# Altium footprint library Connector.PcbLib: 536 footprints (part 13 of 34)
Each footprint in its own frame and in the unit in brackets; x right, y up, seen from the top. Pads: shape width x height; smd on the part's side, far side on the other; paste and mask are expansions set on the pad; w line width, h text height; cw(c..) or ccw(c..) is an arc to the next point about the centre after c.
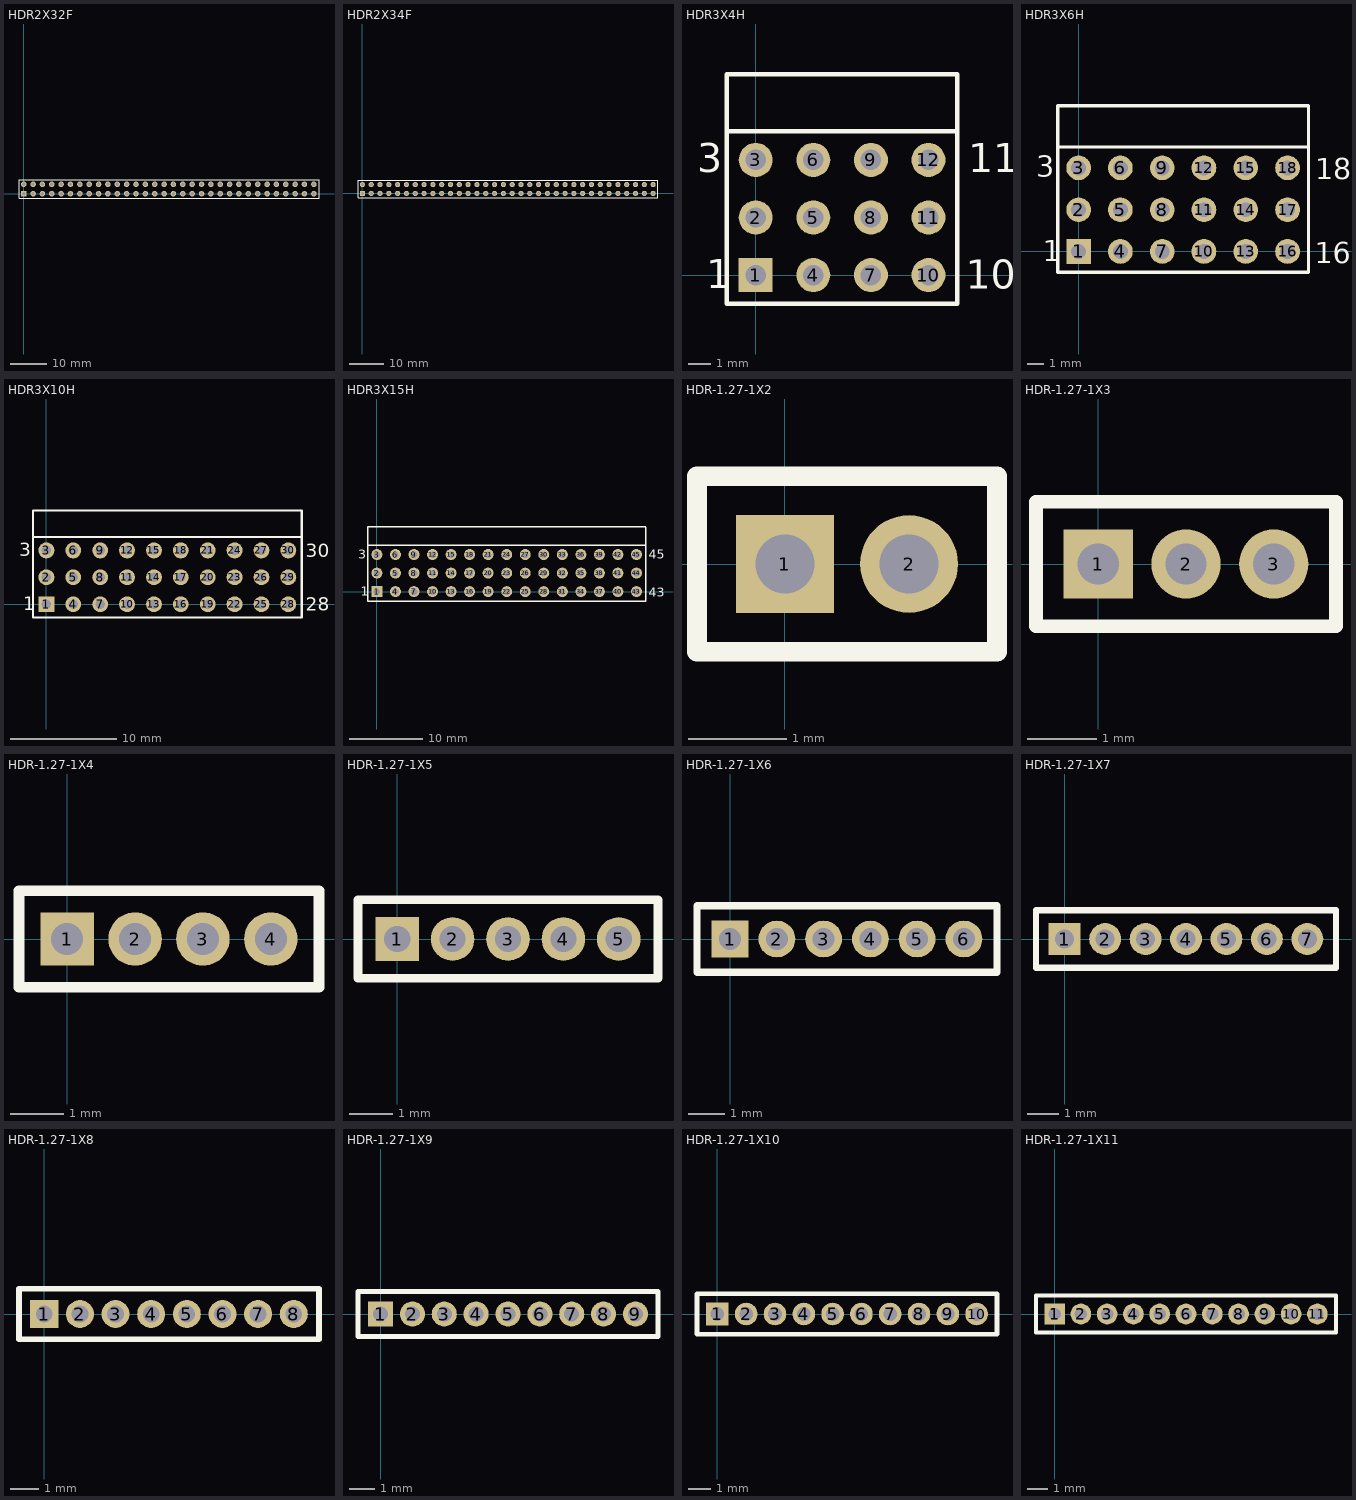
[diagram p12: the footprints below, top view; thin cyan lines are the x and y axes]

## HDR2X32F [mm] "Connector; Header; 30x2 Position"
pads (64):
  rect 1.5x1.5 hole 0.9: 1(0,0)
  round 1.5 hole 0.9: 2(0,2.54) 3(2.54,0) 4(2.54,2.54) 5(5.08,0) 6(5.08,2.54) 7(7.62,0) 8(7.62,2.54) 9(10.16,0) 10(10.16,2.54) 11(12.7,0) 12(12.7,2.54) 13(15.24,0) 14(15.24,2.54) 15(17.78,0) 16(17.78,2.54) 17(20.32,0) 18(20.32,2.54) 19(22.86,0) 20(22.86,2.54) 21(25.4,0) 22(25.4,2.54) 23(27.94,0) 24(27.94,2.54) 25(30.48,0) 26(30.48,2.54) 27(33.02,0) 28(33.02,2.54) 29(35.56,0) 30(35.56,2.54) 31(38.1,0) 32(38.1,2.54) 33(40.64,0) 34(40.64,2.54) 35(43.18,0) 36(43.18,2.54) 37(45.72,0) 38(45.72,2.54) 39(48.26,0) 40(48.26,2.54) 41(50.8,0) 42(50.8,2.54) 43(53.34,0) 44(53.34,2.54) 45(55.88,0) 46(55.88,2.54) 47(58.42,0) 48(58.42,2.54) 49(60.96,0) 50(60.96,2.54) 51(63.5,0) 52(63.5,2.54) 53(66.04,0) 54(66.04,2.54) 55(68.58,0) 56(68.58,2.54) 57(71.12,0) 58(71.12,2.54) 59(73.66,0) 60(73.66,2.54) 61(76.2,0) 62(76.2,2.54) 63(78.74,0) 64(78.74,2.54)
Top Overlay:
  lines w0.2: -1.27,-1.27 -1.27,3.81 80.14,3.81 80.14,-1.27 -1.27,-1.27
3D body "HEADER_1X30.STEP": height 8.61, standoff -2.93, extent -1.295,1.27 74.905,3.81
3D body "HEADER_1X30.STEP": height 8.61, standoff -2.93, extent -1.295,-1.27 74.905,1.27
3D body "HEADER_1X2.STEP": height 8.61, standoff -2.93, extent 74.93,1.27 80.01,3.81
3D body "HEADER_1X2.STEP": height 8.61, standoff -2.93, extent 74.93,-1.27 80.01,1.27

## HDR2X34F [mm] "Connector; Header; 30x2 Position"
pads (68):
  rect 1.5x1.5 hole 0.9: 1(0,0)
  round 1.5 hole 0.9: 2(0,2.54) 3(2.54,0) 4(2.54,2.54) 5(5.08,0) 6(5.08,2.54) 7(7.62,0) 8(7.62,2.54) 9(10.16,0) 10(10.16,2.54) 11(12.7,0) 12(12.7,2.54) 13(15.24,0) 14(15.24,2.54) 15(17.78,0) 16(17.78,2.54) 17(20.32,0) 18(20.32,2.54) 19(22.86,0) 20(22.86,2.54) 21(25.4,0) 22(25.4,2.54) 23(27.94,0) 24(27.94,2.54) 25(30.48,0) 26(30.48,2.54) 27(33.02,0) 28(33.02,2.54) 29(35.56,0) 30(35.56,2.54) 31(38.1,0) 32(38.1,2.54) 33(40.64,0) 34(40.64,2.54) 35(43.18,0) 36(43.18,2.54) 37(45.72,0) 38(45.72,2.54) 39(48.26,0) 40(48.26,2.54) 41(50.8,0) 42(50.8,2.54) 43(53.34,0) 44(53.34,2.54) 45(55.88,0) 46(55.88,2.54) 47(58.42,0) 48(58.42,2.54) 49(60.96,0) 50(60.96,2.54) 51(63.5,0) 52(63.5,2.54) 53(66.04,0) 54(66.04,2.54) 55(68.58,0) 56(68.58,2.54) 57(71.12,0) 58(71.12,2.54) 59(73.66,0) 60(73.66,2.54) 61(76.2,0) 62(76.2,2.54) 63(78.74,0) 64(78.74,2.54) 65(81.28,0) 66(81.28,2.54) 67(83.82,0) 68(83.82,2.54)
Top Overlay:
  lines w0.2: -1.27,-1.27 85.22,-1.27 85.22,3.81 -1.27,3.81 -1.27,-1.27
Bottom Overlay:
  text "1" at -55.88,-0.508 h1.27
3D body "HEADER_1X2.STEP": height 8.61, standoff -2.93, extent 74.93,-1.27 80.01,1.27
3D body "HEADER_1X2.STEP": height 8.61, standoff -2.93, extent 74.93,1.27 80.01,3.81
3D body "HEADER_1X30.STEP": height 8.61, standoff -2.93, extent -1.295,-1.27 74.905,1.27
3D body "HEADER_1X30.STEP": height 8.61, standoff -2.93, extent -1.295,1.27 74.905,3.81
3D body "HEADER_1X2.STEP": height 8.61, standoff -2.93, extent 80.01,1.27 85.09,3.81
3D body "HEADER_1X2.STEP": height 8.61, standoff -2.93, extent 80.01,-1.27 85.09,1.27

## HDR3X4H [mm] "3排4针排针"
pads (12):
  rect 1.5x1.5 hole 0.9: 1(0,0)
  round 1.5 hole 0.9: 2(0,2.54) 3(0,5.08) 4(2.54,0) 5(2.54,2.54) 6(2.54,5.08) 7(5.08,0) 8(5.08,2.54) 9(5.08,5.08) 10(7.62,0) 11(7.62,2.54) 12(7.62,5.08)
Top Overlay:
  lines w0.2: 8.89,-1.27 -1.27,-1.27 -1.27,6.35 ; 8.89,-1.245 8.89,6.35 ; -1.27,6.35 8.89,6.35 ; -1.27,6.35 -1.27,8.865 8.89,8.865 8.89,6.35
  text "1" at -2.184,-0.584 h1.27
  text "3" at -2.591,4.547 h1.27
  text "10" at 9.271,-0.61 h1.27
  text "11" at 9.373,4.547 h1.27

## HDR3X6H [mm] "3排6针排针"
pads (18):
  rect 1.5x1.5 hole 0.9: 1(0,0)
  round 1.5 hole 0.9: 2(0,2.54) 3(0,5.08) 4(2.54,0) 5(2.54,2.54) 6(2.54,5.08) 7(5.08,0) 8(5.08,2.54) 9(5.08,5.08) 10(7.62,0) 11(7.62,2.54) 12(7.62,5.08) 13(10.16,0) 14(10.16,2.54) 15(10.16,5.08) 16(12.7,0) 17(12.7,2.54) 18(12.7,5.08)
Top Overlay:
  lines w0.2: -1.27,6.35 13.97,6.35 ; -1.27,6.35 -1.27,8.865 13.97,8.865 13.97,6.35 ; -1.27,6.35 -1.27,-1.27 13.97,-1.27 13.97,6.35
  text "1" at -2.184,-0.584 h1.27
  text "3" at -2.591,4.547 h1.27
  text "16" at 14.351,-0.711 h1.27
  text "18" at 14.376,4.394 h1.27

## HDR3X10H [mm] "3排10针排针"
pads (30):
  rect 1.5x1.5 hole 0.9: 1(0,0)
  round 1.5 hole 0.9: 2(0,2.54) 3(0,5.08) 4(2.54,0) 5(2.54,2.54) 6(2.54,5.08) 7(5.08,0) 8(5.08,2.54) 9(5.08,5.08) 10(7.62,0) 11(7.62,2.54) 12(7.62,5.08) 13(10.16,0) 14(10.16,2.54) 15(10.16,5.08) 16(12.7,0) 17(12.7,2.54) 18(12.7,5.08) 19(15.24,0) 20(15.24,2.54) 21(15.24,5.08) 22(17.78,0) 23(17.78,2.54) 24(17.78,5.08) 25(20.32,0) 26(20.32,2.54) 27(20.32,5.08) 28(22.86,0) 29(22.86,2.54) 30(22.86,5.08)
Top Overlay:
  lines w0.2: 24.13,6.248 24.13,-1.27 -1.27,-1.27 -1.27,6.35 ; -1.27,6.35 24.13,6.35 24.13,8.865 -1.27,8.865 -1.27,6.35
  text "1" at -2.184,-0.584 h1.27
  text "3" at -2.591,4.547 h1.27
  text "28" at 24.486,-0.61 h1.27
  text "30" at 24.486,4.42 h1.27

## HDR3X15H [mm] "3排15针排针"
pads (45):
  rect 1.5x1.5 hole 0.9: 1(0,0)
  round 1.5 hole 0.9: 2(0,2.54) 3(0,5.08) 4(2.54,0) 5(2.54,2.54) 6(2.54,5.08) 7(5.08,0) 8(5.08,2.54) 9(5.08,5.08) 10(7.62,0) 11(7.62,2.54) 12(7.62,5.08) 13(10.16,0) 14(10.16,2.54) 15(10.16,5.08) 16(12.7,0) 17(12.7,2.54) 18(12.7,5.08) 19(15.24,0) 20(15.24,2.54) 21(15.24,5.08) 22(17.78,0) 23(17.78,2.54) 24(17.78,5.08) 25(20.32,0) 26(20.32,2.54) 27(20.32,5.08) 28(22.86,0) 29(22.86,2.54) 30(22.86,5.08) 31(25.4,0) 32(25.4,2.54) 33(25.4,5.08) 34(27.94,0) 35(27.94,2.54) 36(27.94,5.08) 37(30.48,0) 38(30.48,2.54) 39(30.48,5.08) 40(33.02,0) 41(33.02,2.54) 42(33.02,5.08) 43(35.56,0) 44(35.56,2.54) 45(35.56,5.08)
Top Overlay:
  lines w0.2: 36.83,6.248 36.83,-1.295 -1.27,-1.295 -1.27,6.35 ; 36.83,6.274 36.83,8.839 ; 36.83,6.35 -1.27,6.35 ; 36.83,8.865 -1.27,8.865 -1.27,6.35
  text "45" at 37.236,4.496 h1.27
  text "43" at 37.236,-0.711 h1.27
  text "3" at -2.591,4.496 h1.27
  text "1" at -2.184,-0.584 h1.27

## HDR-1.27-1X2 [mm] "Connector; Header; 2 Position"
pads (2):
  rect 1x1 hole 0.6: 1(0,0)
  round 1 hole 0.6: 2(1.27,0)
Top Overlay:
  lines w0.2: -0.9,-0.9 -0.9,0.9 2.17,0.9 2.17,-0.9 -0.9,-0.9
3D body "MHDR1X2.STEP": height 2.48, standoff -2.52, extent -0.851,-1.118 2.07,1.092

## HDR-1.27-1X3 [mm] "Connector; Header; 3 Position"
pads (3):
  rect 1x1 hole 0.6: 1(0,0)
  round 1 hole 0.6: 2(1.27,0) 3(2.54,0)
Top Overlay:
  lines w0.2: -0.9,-0.9 3.44,-0.9 3.44,0.9 -0.9,0.9 -0.9,-0.9
3D body "MHDR1X3.STEP": height 2.5, standoff -2.5, extent -0.825,-1.067 3.365,1.143

## HDR-1.27-1X4 [mm] "Connector; Header; 4 Position"
pads (4):
  rect 1x1 hole 0.6: 1(0,0)
  round 1 hole 0.6: 2(1.27,0) 3(2.54,0) 4(3.81,0)
Top Overlay:
  lines w0.2: -0.9,-0.9 4.71,-0.9 4.71,0.9 -0.9,0.9 -0.9,-0.9
3D body "MHDR1X4.STEP": height 2.48, standoff -2.52, extent -0.8,-1.118 4.661,1.092

## HDR-1.27-1X5 [mm] "Connector; Header; 5 Position"
pads (5):
  rect 1x1 hole 0.6: 1(0,0)
  round 1 hole 0.6: 2(1.27,0) 3(2.54,0) 4(3.81,0) 5(5.08,0)
Top Overlay:
  lines w0.2: -0.9,-0.9 -0.9,0.9 5.98,0.9 5.98,-0.9 -0.9,-0.9
3D body "MHDR1X5.STEP": height 2.48, standoff -2.52, extent -0.813,-1.105 5.918,1.105

## HDR-1.27-1X6 [mm] "Connector; Header; 6 Position"
pads (6):
  rect 1x1 hole 0.6: 1(0,0)
  round 1 hole 0.6: 2(1.27,0) 3(2.54,0) 4(3.81,0) 5(5.08,0) 6(6.35,0)
Top Overlay:
  lines w0.2: -0.9,-0.9 7.25,-0.9 7.25,0.9 -0.9,0.9 -0.9,-0.9
3D body "MHDR1X6.STEP": height 2.48, standoff -2.52, extent -1.079,-0.787 7.48,0.864

## HDR-1.27-1X7 [mm] "Connector; Header; 7 Position"
pads (7):
  rect 1x1 hole 0.6: 1(0,0)
  round 1 hole 0.6: 2(1.27,0) 3(2.54,0) 4(3.81,0) 5(5.08,0) 6(6.35,0) 7(7.62,0)
Top Overlay:
  lines w0.2: -0.9,-0.9 8.52,-0.9 8.52,0.9 -0.9,0.9 -0.9,-0.9
3D body "MHDR1X7.STEP": height 2.48, standoff -2.52, extent -1.105,-0.787 8.725,0.864

## HDR-1.27-1X8 [mm] "Connector; Header; 8 Position"
pads (8):
  rect 1x1 hole 0.6: 1(0,0)
  round 1 hole 0.6: 2(1.27,0) 3(2.54,0) 4(3.81,0) 5(5.08,0) 6(6.35,0) 7(7.62,0) 8(8.89,0)
Top Overlay:
  lines w0.2: -0.9,-0.9 -0.9,0.9 9.79,0.9 9.79,-0.9 -0.9,-0.9
3D body "MHDR1X8.STEP": height 2.48, standoff -2.52, extent -1.105,-0.838 9.995,0.813

## HDR-1.27-1X9 [mm] "Connector; Header; 9 Position"
pads (9):
  rect 1x1 hole 0.6: 1(0,0)
  round 1 hole 0.6: 2(1.27,0) 3(2.54,0) 4(3.81,0) 5(5.08,0) 6(6.35,0) 7(7.62,0) 8(8.89,0) 9(10.16,0)
Top Overlay:
  lines w0.2: -0.9,-0.9 11.06,-0.9 11.06,0.9 -0.9,0.9 -0.9,-0.9
3D body "MHDR1X9.STEP": height 2.48, standoff -2.52, extent -1.079,-0.864 11.29,0.787

## HDR-1.27-1X10 [mm] "Connector; Header; 10 Position"
pads (10):
  rect 1x1 hole 0.6: 1(0,0)
  round 1 hole 0.6: 2(1.27,0) 3(2.54,0) 4(3.81,0) 5(5.08,0) 6(6.35,0) 7(7.62,0) 8(8.89,0) 9(10.16,0) 10(11.43,0)
Top Overlay:
  lines w0.2: -0.9,-0.9 -0.9,0.9 12.33,0.9 12.33,-0.9 -0.9,-0.9
3D body "MHDR1X10.STEP": height 2.48, standoff -2.52, extent -1.079,-0.864 12.56,0.787

## HDR-1.27-1X11 [mm] "Connector; Header; 11 Position"
pads (11):
  rect 1x1 hole 0.6: 1(0,0)
  round 1 hole 0.6: 2(1.27,0) 3(2.54,0) 4(3.81,0) 5(5.08,0) 6(6.35,0) 7(7.62,0) 8(8.89,0) 9(10.16,0) 10(11.43,0) 11(12.7,0)
Top Overlay:
  lines w0.2: -0.9,-0.9 -0.9,0.9 13.6,0.9 13.6,-0.9 -0.9,-0.9
3D body "MHDR1X11.STEP": height 2.48, standoff -2.52, extent -1.105,-0.838 13.805,0.813